# Altium footprint library test_lib.PcbLib: 57 footprints (part 2 of 4)
Each footprint in its own frame and in the unit in brackets; x right, y up, seen from the top. Pads: shape width x height; smd on the part's side, far side on the other; paste and mask are expansions set on the pad; w line width, h text height; cw(c..) or ccw(c..) is an arc to the next point about the centre after c.
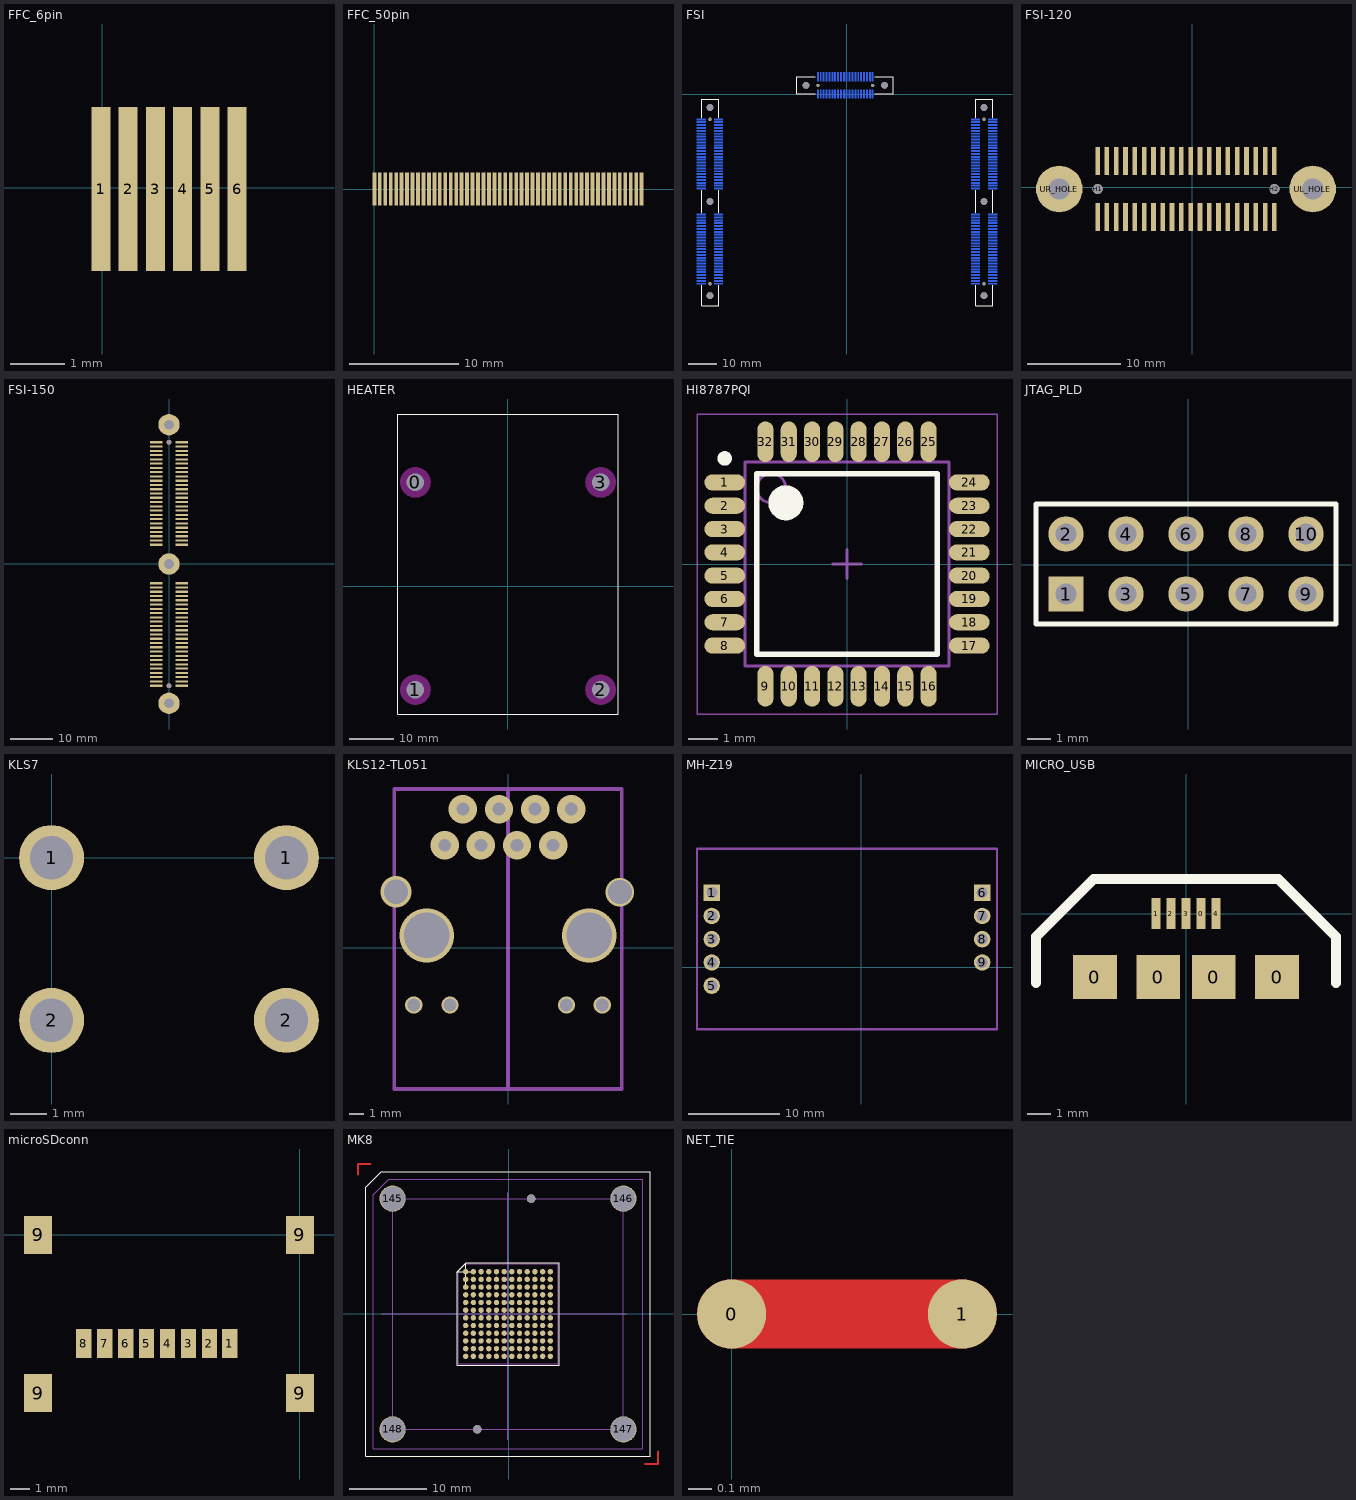
[diagram p1: the footprints below, top view; thin cyan lines are the x and y axes]

## FFC_6pin [mm]
pads (6):
  rect 0.35x3 smd paste+0 mask+0: 1(-0.025,-0.025) 3(0.975,-0.025) 4(1.475,-0.025) 5(1.975,-0.025) 6(2.475,-0.025)
  rect 0.35x3 smd mask+0: 2(0.475,-0.025)

## FFC_50pin [mm] "display connector"
pads (50):
  rect 0.35x3 smd paste+0 mask+0: 1(24.5,0) 2(24,0) 3(23.5,0) 4(23,0) 6(22,0) 7(21.5,0) 8(21,0) 10(20,0) 11(19.5,0) 12(19,0) 14(18,0) 15(17.5,0) 16(17,0) 18(16,0) 19(15.5,0) 20(15,0) 22(14,0) 23(13.5,0) 24(13,0) 26(12,0) 27(11.5,0) 28(11,0) 30(10,0) 31(9.5,0) 32(9,0) 34(8,0) 35(7.5,0) 36(7,0) 38(6,0) 39(5.5,0) 40(5,0) 42(4,0) 43(3.5,0) 44(3,0) 46(2,0) 47(1.5,0) 48(1,0) 50(0,0)
  rect 0.35x3 smd mask+0: 5(22.5,0) 9(20.5,0) 13(18.5,0) 17(16.5,0) 21(14.5,0) 25(12.5,0) 29(10.5,0) 33(8.5,0) 37(6.5,0) 41(4.5,0) 45(2.5,0) 49(0.5,0)

## FSI [mm]
pads (254):
  rect 0.5x3 smd far side: 1(9.069,-0.015) 2(8.069,-0.015) 3(7.069,-0.015) 4(6.069,-0.015) 5(5.069,-0.015) 6(4.069,-0.015) 7(3.069,-0.015) 8(2.069,-0.015) 9(1.069,-0.015) 10(0.069,-0.015) 11(-0.931,-0.015) 12(-1.931,-0.015) 13(-2.931,-0.015) 14(-3.931,-0.015) 15(-4.931,-0.015) 16(-5.931,-0.015) 17(-6.931,-0.015) 18(-7.931,-0.015) 19(-8.931,-0.015) 20(-9.931,-0.015) 21(-9.931,5.985) 22(-8.931,5.985) 23(-7.931,5.985) 24(-6.931,5.985) 25(-5.931,5.985) 26(-4.931,5.985) 27(-3.931,5.985) 28(-2.931,5.985) 29(-1.931,5.985) 30(-0.931,5.985) 31(0.069,5.985) 32(1.069,5.985) 33(2.069,5.985) 34(3.069,5.985) 35(4.069,5.985) 36(5.069,5.985) 37(6.069,5.985) 38(7.069,5.985) 39(8.069,5.985) 40(9.069,5.985)
  rect 3x0.5 smd far side: 41(44.672,-65.764) 42(50.672,-65.764) 43(44.672,-64.764) 44(50.672,-64.764) 45(44.672,-63.764) 46(50.672,-63.764) 47(44.672,-62.764) 48(50.672,-62.764) 49(44.672,-61.764) 50(50.672,-61.764) 51(44.672,-60.764) 52(50.672,-60.764) 53(44.672,-59.764) 54(50.672,-59.764) 55(44.672,-58.764) 56(50.672,-58.764) 57(44.672,-57.764) 58(50.672,-57.764) 59(44.672,-56.764) 60(50.672,-56.764) 61(44.672,-55.764) 62(50.672,-55.764) 63(44.672,-54.764) 64(50.672,-54.764) 65(44.672,-53.764) 66(50.672,-53.764) 67(44.672,-52.764) 68(50.672,-52.764) 69(44.672,-51.764) 70(50.672,-51.764) 71(44.672,-50.764) 72(50.672,-50.764) 73(44.672,-49.764) 74(50.672,-49.764) 75(44.672,-48.764) 76(50.672,-48.764) 77(44.672,-47.764) 78(50.672,-47.764) 79(44.672,-46.764) 80(50.672,-46.764) 81(44.672,-45.764) 82(50.672,-45.764) 83(44.672,-44.764) 84(50.672,-44.764) 85(44.672,-43.764) 86(50.672,-43.764) 87(44.672,-42.764) 88(50.672,-42.764) 89(44.672,-41.764) 90(50.672,-41.764) 91(44.672,-32.764) 92(50.672,-32.764) 93(44.672,-31.764) 94(50.672,-31.764) 95(44.672,-30.764) 96(50.672,-30.764) 97(44.672,-29.764) 98(50.672,-29.764) 99(44.672,-28.764) 100(50.672,-28.764) 101(44.672,-27.764) 102(50.672,-27.764) 103(44.672,-26.764) 104(50.672,-26.764) 105(44.672,-25.764) 106(50.672,-25.764) 107(44.672,-24.764) 108(50.672,-24.764) 109(44.672,-23.764) 110(50.672,-23.764) 111(44.672,-22.764) 112(50.672,-22.764) 113(44.672,-21.764) 114(50.672,-21.764) 115(44.672,-20.764) 116(50.672,-20.764) 117(44.672,-19.764) 118(50.672,-19.764) 119(44.672,-18.764) 120(50.672,-18.764) 121(44.672,-17.764) 122(50.672,-17.764) 123(44.672,-16.764) 124(50.672,-16.764) 125(44.672,-15.764) 126(50.672,-15.764) 127(44.672,-14.764) 128(50.672,-14.764) 129(44.672,-13.764) 130(50.672,-13.764) 131(44.672,-12.764) 132(50.672,-12.764) 133(44.672,-11.764) 134(50.672,-11.764) 135(44.672,-10.764) 136(50.672,-10.764) 137(44.672,-9.764) 138(50.672,-9.764) 139(44.672,-8.764) 140(50.672,-8.764) 141(-50.328,-65.764) 142(-44.328,-65.764) 143(-50.328,-64.764) 144(-44.328,-64.764) 145(-50.328,-63.764) 146(-44.328,-63.764) 147(-50.328,-62.764) 148(-44.328,-62.764) 149(-50.328,-61.764) 150(-44.328,-61.764) 151(-50.328,-60.764) 152(-44.328,-60.764) 153(-50.328,-59.764) 154(-44.328,-59.764) 155(-50.328,-58.764) 156(-44.328,-58.764) 157(-50.328,-57.764) 158(-44.328,-57.764) 159(-50.328,-56.764) 160(-44.328,-56.764) 161(-50.328,-55.764) 162(-44.328,-55.764) 163(-50.328,-54.764) 164(-44.328,-54.764) 165(-50.328,-53.764) 166(-44.328,-53.764) 167(-50.328,-52.764) 168(-44.328,-52.764) 169(-50.328,-51.764) 170(-44.328,-51.764) 171(-50.328,-50.764) 172(-44.328,-50.764) 173(-50.328,-49.764) 174(-44.328,-49.764) 175(-50.328,-48.764) 176(-44.328,-48.764) 177(-50.328,-47.764) 178(-44.328,-47.764) 179(-50.328,-46.764) 180(-44.328,-46.764) 181(-50.328,-45.764) 182(-44.328,-45.764) 183(-50.328,-44.764) 184(-44.328,-44.764) 185(-50.328,-43.764) 186(-44.328,-43.764) 187(-50.328,-42.764) 188(-44.328,-42.764) 189(-50.328,-41.764) 190(-44.328,-41.764) 191(-50.328,-32.764) 192(-44.328,-32.764) 193(-50.328,-31.764) 194(-44.328,-31.764) 195(-50.328,-30.764) 196(-44.328,-30.764) 197(-50.328,-29.764) 198(-44.328,-29.764) 199(-50.328,-28.764) 200(-44.328,-28.764) 201(-50.328,-27.764) 202(-44.328,-27.764) 203(-50.328,-26.764) 204(-44.328,-26.764) 205(-50.328,-25.764) 206(-44.328,-25.764) 207(-50.328,-24.764) 208(-44.328,-24.764) 209(-50.328,-23.764) 210(-44.328,-23.764) 211(-50.328,-22.764) 212(-44.328,-22.764) 213(-50.328,-21.764) 214(-44.328,-21.764) 215(-50.328,-20.764) 216(-44.328,-20.764) 217(-50.328,-19.764) 218(-44.328,-19.764) 219(-50.328,-18.764) 220(-44.328,-18.764) 221(-50.328,-17.764) 222(-44.328,-17.764) 223(-50.328,-16.764) 224(-44.328,-16.764) 225(-50.328,-15.764) 226(-44.328,-15.764) 227(-50.328,-14.764) 228(-44.328,-14.764) 229(-50.328,-13.764) 230(-44.328,-13.764) 231(-50.328,-12.764) 232(-44.328,-12.764) 233(-50.328,-11.764) 234(-44.328,-11.764) 235(-50.328,-10.764) 236(-44.328,-10.764) 237(-50.328,-9.764) 238(-44.328,-9.764) 239(-50.328,-8.764) 240(-44.328,-8.764)
  round 2.3 hole 2.3 unplated: h1(-14.051,2.985) h4(13.189,2.985) h5(-47.328,-69.884) h7(-47.328,-37.264) h9(-47.328,-4.644) h10(47.672,-69.884) h12(47.672,-37.264) h14(47.672,-4.644)
  round 1.1 hole 1.1 unplated: h2(-9.931,2.985) h3(9.069,2.985) h6(-47.328,-65.764) h8(-47.328,-8.764) h11(47.672,-65.764) h13(47.672,-8.764)
Top Overlay:
  lines w0.1: -50.248,-66.324 -50.248,-73.324 -44.248,-73.324 -44.248,-66.324 ; -50.248,-41.324 -50.248,-33.324 ; -50.248,-8.324 -50.248,-1.824 -44.248,-1.824 -44.248,-8.324 ; -44.248,-41.324 -44.248,-33.324 ; -10.751,0.065 -17.251,0.065 -17.251,6.065 -10.751,6.065 ; 9.749,0.065 16.249,0.065 16.249,6.065 9.749,6.065 ; 44.752,-66.324 44.752,-73.324 50.752,-73.324 50.752,-66.324 ; 44.752,-41.324 44.752,-33.324 ; 44.752,-8.324 44.752,-1.824 50.752,-1.824 50.752,-8.324 ; 50.752,-41.324 50.752,-33.324
3D body "FSI-120-06-L-D-M-AD.stp": height -1.45, standoff -10.25, extent -17.481,-2.015 16.619,7.985
3D body "FSI-150-06-L-D-M-AD.stp": height -1.45, standoff -10.25, extent 42.594,-73.294 52.594,-1.194
3D body "FSI-150-06-L-D-M-AD.stp": height -1.45, standoff -10.25, extent -52.348,-73.294 -42.348,-1.194

## FSI-120 [mm]
pads (44):
  rect 0.5x3 smd: 1(8.833,-3.186) 2(7.833,-3.186) 3(6.833,-3.186) 4(5.833,-3.186) 5(4.833,-3.186) 6(3.833,-3.186) 7(2.833,-3.186) 8(1.833,-3.186) 9(0.833,-3.186) 10(-0.167,-3.186) 11(-1.167,-3.186) 12(-2.167,-3.186) 13(-3.167,-3.186) 14(-4.167,-3.186) 15(-5.167,-3.186) 16(-6.167,-3.186) 17(-7.167,-3.186) 18(-8.167,-3.186) 19(-9.167,-3.186) 20(-10.167,-3.186) 21(-10.167,2.814) 22(-9.167,2.814) 23(-8.167,2.814) 24(-7.167,2.814) 25(-6.167,2.814) 26(-5.167,2.814) 27(-4.167,2.814) 28(-3.167,2.814) 29(-2.167,2.814) 30(-1.167,2.814) 31(-0.167,2.814) 32(0.833,2.814) 33(1.833,2.814) 34(2.833,2.814) 35(3.833,2.814) 36(4.833,2.814) 37(5.833,2.814) 38(6.833,2.814) 39(7.833,2.814) 40(8.833,2.814)
  round 1.1 hole 1.1 unplated: H1(-10.167,-0.186) H2(8.833,-0.186)
  round 5 hole 2.3: UL_HOLE(12.953,-0.186) UR_HOLE(-14.287,-0.186)
3D body "FSI-120-06-L-D-M-AD.stp": height 8.25, standoff -0.55, extent -17.717,-5.186 16.383,4.814

## FSI-150 [mm]
pads (105):
  round 1.1 hole 1.1 unplated: 1(-0.063,-28.521) 1(-0.063,28.479)
  rect 3x0.5 smd: R_1(2.937,-28.52) R_2(-3.063,-28.52) R_3(2.937,-27.52) R_4(-3.063,-27.52) R_5(2.937,-26.52) R_6(-3.063,-26.52) R_7(2.937,-25.52) R_8(-3.063,-25.52) R_9(2.937,-24.52) R_10(-3.063,-24.52) R_11(2.937,-23.52) R_12(-3.063,-23.52) R_13(2.937,-22.52) R_14(-3.063,-22.52) R_15(2.937,-21.52) R_16(-3.063,-21.52) R_17(2.937,-20.52) R_18(-3.063,-20.52) R_19(2.937,-19.52) R_20(-3.063,-19.52) R_21(2.937,-18.52) R_22(-3.063,-18.52) R_23(2.937,-17.52) R_24(-3.063,-17.52) R_25(2.937,-16.52) R_26(-3.063,-16.52) R_27(2.937,-15.52) R_28(-3.063,-15.52) R_29(2.937,-14.52) R_30(-3.063,-14.52) R_31(2.937,-13.52) R_32(-3.063,-13.52) R_33(2.937,-12.52) R_34(-3.063,-12.52) R_35(2.937,-11.52) R_36(-3.063,-11.52) R_37(2.937,-10.52) R_38(-3.063,-10.52) R_39(2.937,-9.52) R_40(-3.063,-9.52) R_41(2.937,-8.52) R_42(-3.063,-8.52) R_43(2.937,-7.52) R_44(-3.063,-7.52) R_45(2.937,-6.52) R_46(-3.063,-6.52) R_47(2.937,-5.52) R_48(-3.063,-5.52) R_49(2.937,-4.52) R_50(-3.063,-4.52) R_51(2.937,4.479) R_52(-3.063,4.479) R_53(2.937,5.479) R_54(-3.063,5.479) R_55(2.937,6.479) R_56(-3.063,6.479) R_57(2.937,7.479) R_58(-3.063,7.479) R_59(2.937,8.479) R_60(-3.063,8.479) R_61(2.937,9.479) R_62(-3.063,9.479) R_63(2.937,10.479) R_64(-3.063,10.479) R_65(2.937,11.479) R_66(-3.063,11.479) R_67(2.937,12.479) R_68(-3.063,12.479) R_69(2.937,13.479) R_70(-3.063,13.479) R_71(2.937,14.479) R_72(-3.063,14.479) R_73(2.937,15.479) R_74(-3.063,15.479) R_75(2.937,16.479) R_76(-3.063,16.479) R_77(2.937,17.479) R_78(-3.063,17.479) R_79(2.937,18.479) R_80(-3.063,18.479) R_81(2.937,19.479) R_82(-3.063,19.479) R_83(2.937,20.479) R_84(-3.063,20.479) R_85(2.937,21.479) R_86(-3.063,21.479) R_87(2.937,22.479) R_88(-3.063,22.479) R_89(2.937,23.479) R_90(-3.063,23.479) R_91(2.937,24.479) R_92(-3.063,24.479) R_93(2.937,25.479) R_94(-3.063,25.479) R_95(2.937,26.479) R_96(-3.063,26.479) R_97(2.937,27.479) R_98(-3.063,27.479) R_99(2.937,28.479) R_100(-3.063,28.479)
  round 5 hole 2.3: RB_HOLE(-0.063,-32.641) RM_HOLE(-0.063,-0.021) RU_HOLE(-0.063,32.599)
3D body "FSI-150-06-L-D-M-AD.stp": height 8.25, standoff -0.55, extent -5.141,-36.051 4.859,36.049

## HEATER [mm]
pads (8):
  round 7 on Keep-Out: 0(-21,23.5) 1(-21,-23.5) 2(21,-23.5) 3(21,23.5)
  round 0 hole 4: Hole(-21,-23.5) Hole(-21,23.5) Hole(21,-23.5) Hole(21,23.5)
Top Overlay:
  lines w0.254: -25,-29 -25,39 25,39 25,-29 -25,-29

## HI8787PQI [mm]
pads (32):
  oval 1.4x0.55 smd: 1(-4.2,2.8) 2(-4.2,2) 3(-4.2,1.2) 4(-4.2,0.4) 5(-4.2,-0.4) 6(-4.2,-1.2) 7(-4.2,-2) 8(-4.2,-2.8) 17(4.2,-2.8) 18(4.2,-2) 19(4.2,-1.2) 20(4.2,-0.4) 21(4.2,0.4) 22(4.2,1.2) 23(4.2,2) 24(4.2,2.8)
  oval 0.55x1.4 smd: 9(-2.8,-4.2) 10(-2,-4.2) 11(-1.2,-4.2) 12(-0.4,-4.2) 13(0.4,-4.2) 14(1.2,-4.2) 15(2,-4.2) 16(2.8,-4.2) 25(2.8,4.2) 26(2,4.2) 27(1.2,4.2) 28(0.4,4.2) 29(-0.4,4.2) 30(-1.2,4.2) 31(-2,4.2) 32(-2.8,4.2)
Top Overlay:
  circle w0.25: c-4.2,3.625 r0.125
  circle w0.6: c-2.1,2.1 r0.3
  lines w0.2: -3.1,-3.1 -3.1,3.1 3.1,3.1 3.1,-3.1 -3.1,-3.1
Mechanical 13:
  circle w0.1: c-2.6,2.6 r0.5
  lines w0.1: -3.5,-3.5 -3.5,3.5 3.5,3.5 3.5,-3.5 -3.5,-3.5
Mechanical 15:
  lines w0.05: -5.15,-5.15 -5.15,5.15 5.15,5.15 5.15,-5.15 -5.15,-5.15
  lines w0.1: -0.5,0 0.5,0 ; 0,-0.5 0,0.5
3D body: height 1.2, standoff 0.05, extent -3.5,-3.5 3.5,3.5

## JTAG_PLD [mm]
pads (10):
  rect 1.5x1.5 hole 0.9: 1(-5.166,-1.248)
  round 1.5 hole 0.9: 2(-5.166,1.292) 3(-2.626,-1.248) 4(-2.626,1.292) 5(-0.086,-1.248) 6(-0.086,1.292) 7(2.454,-1.248) 8(2.454,1.292) 9(4.994,-1.248) 10(4.994,1.292)
Top Overlay:
  lines w0.2: -6.436,-2.518 6.264,-2.518 6.264,2.562 -6.436,2.562 -6.436,-2.518
3D body "User Library-BoxHeader_2R5W_254P_00D.step": height 9.1, standoff -3.1, extent -10.3,-4.4 10.3,4.4

## KLS7 [mm] "button"
pads (4):
  round 1.8 hole 1.2: 1(0,0) 1(6.5,0) 2(0,-4.5) 2(6.5,-4.5)
3D body "User Library-TS-A1PS-130.step": height 4.3, standoff -3.5, extent -0.724,-5.3 7.275,0.7

## KLS12-TL051 [mm] "RJ45 with magnetics"
height 13.4
via -4.472,7.232 diameter 2 hole 0.9
via -1.932,7.232 diameter 2 hole 0.9
via 3.148,7.232 diameter 2 hole 0.9
via 0.608,7.232 diameter 2 hole 0.9
via -3.202,9.772 diameter 2 hole 0.9
via -0.662,9.772 diameter 2 hole 0.9
via 1.878,9.772 diameter 2 hole 0.9
via 4.418,9.772 diameter 2 hole 0.9
via -7.907,3.957 diameter 2.2 hole 1.7
via 7.843,3.932 diameter 2 hole 1.7
via -5.742,0.882 diameter 3.8 hole 3.2
via 5.688,0.882 diameter 3.8 hole 3.2
via 6.603,-4.018 diameter 1.2 hole 0.9
via -6.657,-4.018 diameter 1.2 hole 0.9
via 4.077,-4.018 diameter 1.2 hole 0.9
via -4.103,-4.018 diameter 1.2 hole 0.9
Mechanical 15:
  lines w0.255: -0.027,-9.918 -0.027,-4.53 -0.027,11.182 ; -8.027,-9.918 7.973,-9.918 7.973,-4.144 7.973,11.182 -8.027,11.182 -8.027,-9.918

## MH-Z19 [mm] "Infrared CO2 Module"
pads (9):
  rect 1.8x1.8 hole 1.2: 1(-16.31,8.135) 6(13.23,8.135)
  round 1.8 hole 1.2: 2(-16.31,5.595) 3(-16.31,3.055) 4(-16.31,0.515) 5(-16.31,-2.025) 7(13.23,5.595) 8(13.23,3.055) 9(13.23,0.515)
Mechanical 13:
  lines w0.254: -17.925,-6.8 -17.925,12.95 13.225,12.95 14.85,12.95 14.85,-6.8 -16.975,-6.8 -17.925,-6.8
3D body "User Library-Winsen - MH-Z19.step": height 9, standoff 0, extent -17.855,-6.85 14.715,12.9

## MICRO_USB [mm] "smd micro usb connector"
pads (9):
  rect 1.9x1.9 smd: 0(-3.95,-2.75) 0(-1.2,-2.75) 0(1.2,-2.75) 0(3.95,-2.75)
  rect 0.4x1.35 smd mask+0.05: 0(0.65,0) 1(-1.3,0) 2(-0.65,0) 3(0,0) 4(1.3,0)
Top Overlay:
  lines w0.45: -6.5,-3 -6.5,-1 -4,1.5 4,1.5 6.5,-1 6.5,-3
3D body "User Library-micro usb SMD.step": height 2.73, standoff 0.03, extent -3.9,-4.55 3.9,0.45

## microSDconn [mm] "7MSDH-F0-1012"
pads (12):
  rect 0.8x1.5 smd: 1(-3.68,-5.7) 2(-4.75,-5.7) 3(-5.85,-5.7) 4(-6.95,-5.7) 5(-8.05,-5.7) 6(-9.15,-5.7) 7(-10.25,-5.7) 8(-11.35,-5.7)
  rect 1.45x2 smd: 9(-13.75,-8.3) 9(-13.75,0) 9(0,-8.3) 9(0,0)

## MK8 [mm]
pads (150):
  round 3.4 / inner round 3.4 / far side round 6 hole 3.2: 145(-15.071,14.976) 146(14.929,14.976) 147(14.929,-15.024) 148(-15.071,-15.024)
  round 1.1 hole 1.1 unplated: 149(2.929,14.976) 150(-4.071,-15.024)
  round 0.7 smd paste-25.4 mask-25.4: A1(-5.571,5.476) A2(-4.571,5.476) A3(-3.571,5.476) A4(-2.571,5.476) A5(-1.571,5.476) A6(-0.571,5.476) A7(0.429,5.476) A8(1.429,5.476) A9(2.429,5.476) A10(3.429,5.476) A11(4.429,5.476) A12(5.429,5.476) B1(-5.571,4.476) B2(-4.571,4.476) B3(-3.571,4.476) B4(-2.571,4.476) B5(-1.571,4.476) B6(-0.571,4.476) B7(0.429,4.476) B8(1.429,4.476) B9(2.429,4.476) B10(3.429,4.476) B11(4.429,4.476) B12(5.429,4.476) C1(-5.571,3.476) C2(-4.571,3.476) C3(-3.571,3.476) C4(-2.571,3.476) C5(-1.571,3.476) C6(-0.571,3.476) C7(0.429,3.476) C8(1.429,3.476) C9(2.429,3.476) C10(3.429,3.476) C11(4.429,3.476) C12(5.429,3.476) D1(-5.571,2.476) D2(-4.571,2.476) D3(-3.571,2.476) D4(-2.571,2.476) D5(-1.571,2.476) D6(-0.571,2.476) D7(0.429,2.476) D8(1.429,2.476) D9(2.429,2.476) D10(3.429,2.476) D11(4.429,2.476) D12(5.429,2.476) F1(-5.571,1.476) F2(-4.571,1.476) F3(-3.571,1.476) F4(-2.571,1.476) F5(-1.571,1.476) F6(-0.571,1.476) F7(0.429,1.476) F8(1.429,1.476) F9(2.429,1.476) F10(3.429,1.476) F11(4.429,1.476) F12(5.429,1.476) G1(-5.571,0.476) G2(-4.571,0.476) G3(-3.571,0.476) G4(-2.571,0.476) G5(-1.571,0.476) G6(-0.571,0.476) G7(0.429,0.476) G8(1.429,0.476) G9(2.429,0.476) G10(3.429,0.476) G11(4.429,0.476) G12(5.429,0.476) H1(-5.571,-0.524) H2(-4.571,-0.524) H3(-3.571,-0.524) H4(-2.571,-0.524) H5(-1.571,-0.524) H6(-0.571,-0.524) H7(0.429,-0.524) H8(1.429,-0.524) H9(2.429,-0.524) H10(3.429,-0.524) H11(4.429,-0.524) H12(5.429,-0.524) J1(-5.571,-1.524) J2(-4.571,-1.524) J3(-3.571,-1.524) J4(-2.571,-1.524) J5(-1.571,-1.524) J6(-0.571,-1.524) J7(0.429,-1.524) J8(1.429,-1.524) J9(2.429,-1.524) J10(3.429,-1.524) J11(4.429,-1.524) J12(5.429,-1.524) K1(-5.571,-2.524) K2(-4.571,-2.524) K3(-3.571,-2.524) K4(-2.571,-2.524) K5(-1.571,-2.524) K6(-0.571,-2.524) K7(0.429,-2.524) K8(1.429,-2.524) K9(2.429,-2.524) K10(3.429,-2.524) K11(4.429,-2.524) K12(5.429,-2.524) L1(-5.571,-3.524) L2(-4.571,-3.524) L3(-3.571,-3.524) L4(-2.571,-3.524) L5(-1.571,-3.524) L6(-0.571,-3.524) L7(0.429,-3.524) L8(1.429,-3.524) L9(2.429,-3.524) L10(3.429,-3.524) L11(4.429,-3.524) L12(5.429,-3.524) M1(-5.571,-4.524) M2(-4.571,-4.524) M3(-3.571,-4.524) M4(-2.571,-4.524) M5(-1.571,-4.524) M6(-0.571,-4.524) M7(0.429,-4.524) M8(1.429,-4.524) M9(2.429,-4.524) M10(3.429,-4.524) M11(4.429,-4.524) M12(5.429,-4.524) N1(-5.571,-5.524) N2(-4.571,-5.524) N3(-3.571,-5.524) N4(-2.571,-5.524) N5(-1.571,-5.524) N6(-0.571,-5.524) N7(0.429,-5.524) N8(1.429,-5.524) N9(2.429,-5.524) N10(3.429,-5.524) N11(4.429,-5.524) N12(5.429,-5.524)
Top Layer:
  lines w0.25: -19.571,18.076 -19.571,19.476 -17.921,19.476 ; 17.729,-19.524 19.429,-19.524 19.429,-17.924
Top Overlay:
  lines w0.025: -6.571,5.476 -4.571,5.476 ; -5.571,3.476 -5.571,6.476
  lines w0.125: -18.571,-18.524 18.429,-18.524 18.429,18.476 -16.571,18.476 -18.571,16.476 -18.571,-18.524
  lines w0.152: -6.741,5.396 -6.739,-6.691 6.596,-6.691 6.596,6.644 -5.491,6.646 -6.739,5.394
Top Paste:
  drawing of 144 lines, arcs and shapes, not listed
Top Solder:
  drawing of 144 lines, arcs and shapes, not listed
Mechanical 1:
  lines w0.125: -17.571,-17.524 17.429,-17.524 17.429,17.476 -15.571,17.476 -17.571,15.476 -17.571,-17.524
  lines w0.152: -6.541,5.606 -5.631,6.496 6.459,6.496 6.459,-6.504 -6.541,-6.504 -6.541,5.616
Mechanical 3:
  lines w0.125: -16.491,-0.024 15.299,-0.024 ; -15.991,-15.024 15.359,-15.024 ; -15.431,14.976 15.509,14.976 ; -15.071,-15.454 -15.071,15.056 ; -0.071,-16.364 -0.071,15.726 ; 14.929,-15.404 14.929,15.476

## NET_TIE [mm]
pads (2):
  round 0.3 smd mask+0: 0(0,0) 1(1,0)
Top Layer:
  lines w0.3: 0,0 1,0

## Outl_border [mm]